# Altium integrated library WE_WR-WTB_Wire to Board Connectors_2.00 mm_rev15c.IntLib: 70 symbols (continued)
## WE-2.00 mm Male Dual Row Vertical Shrouded Header 62402621622
designator C?
WR-WTB_2,00mm; Manufacturer: Würth Elektronik eiSos GmbH; ComponentLink1 Description: Manufacturer; ComponentLink2 Description: Datasheet; NoPins: 26; Created Date: 6 June 2013; partNo: 62402621622; ComponentLink1URL: http://www.we-online.com; ComponentLink2URL: http://katalog.we-online.de/em/datasheet/6240xx21622.pdf; Created by: Karrer Zheng
footprint 62402621622 (26 pins, Dual Rows, Straight, tin plating)
pins: 1, 2, 3, 4, 5, 6, 7, 8, 9, 10, 11, 12, 13, 14, 15, 16, 17, 18, 19, 20, 21, 22, 23, 24, 25, 26

## WE-2.00 mm Male Dual Row Vertical Shrouded Header 62402821622
designator C?
WR-WTB_2,00mm; Manufacturer: Würth Elektronik eiSos GmbH; ComponentLink1 Description: Manufacturer; ComponentLink2 Description: Datasheet; NoPins: 28; Created Date: 6 June 2013; partNo: 62402821622; ComponentLink1URL: http://www.we-online.com; ComponentLink2URL: http://katalog.we-online.de/em/datasheet/6240xx21622.pdf; Created by: Karrer Zheng
footprint 62402821622 (28 pins, Dual Rows, Straight, tin plating)
pins: 1, 2, 3, 4, 5, 6, 7, 8, 9, 10, 11, 12, 13, 14, 15, 16, 17, 18, 19, 20, 21, 22, 23, 24, 25, 26, 27, 28

## WE-2.00 mm Male Dual Row Vertical Shrouded Header 62403021622
designator pppp
WR-WTB_2,00mm; Manufacturer: Würth Elektronik eiSos GmbH; ComponentLink1 Description: Manufacturer; ComponentLink2 Description: Datasheet; NoPins: 30; Created Date: 6 June 2013; partNo: 62403021622; ComponentLink1URL: http://www.we-online.com; ComponentLink2URL: http://katalog.we-online.de/em/datasheet/6240xx21622.pdf; Created by: Karrer Zheng
footprint 62403021622 (30 pins, Dual Rows, Straight, tin plating)
pins: 1, 2, 3, 4, 5, 6, 7, 8, 9, 10, 11, 12, 13, 14, 15, 16, 17, 18, 19, 20, 21, 22, 23, 24, 25, 26, 27, 28, 29, 30

## WE-2.00 mm Male Dual Row Vertical Shrouded Header 62403221622
designator C?
WR-WTB_2,00mm; Manufacturer: Würth Elektronik eiSos GmbH; ComponentLink1 Description: Manufacturer; ComponentLink2 Description: Datasheet; NoPins: 32; Created Date: 6 June 2013; partNo: 62403221622; ComponentLink1URL: http://www.we-online.com; ComponentLink2URL: http://katalog.we-online.de/em/datasheet/6240xx21622.pdf; Created by: Karrer Zheng
footprint 62403221622 (32 pins, Dual Rows, Straight, tin plating)
pins: 1, 2, 3, 4, 5, 6, 7, 8, 9, 10, 11, 12, 13, 14, 15, 16, 17, 18, 19, 20, 21, 22, 23, 24, 25, 26, 27, 28, 29, 30, 31, 32

## WE-2.00 mm Male Dual Row Vertical Shrouded Header 62403421622
designator C?
WR-WTB_2,00mm; Manufacturer: Würth Elektronik eiSos GmbH; ComponentLink1 Description: Manufacturer; ComponentLink2 Description: Datasheet; NoPins: 34; Created Date: 6 June 2013; partNo: 62403421622; ComponentLink1URL: http://www.we-online.com; ComponentLink2URL: http://katalog.we-online.de/em/datasheet/6240xx21622.pdf; Created by: Karrer Zheng
footprint 62403421622 (34 pins, Dual Rows, Straight, tin plating)
pins: 1, 2, 3, 4, 5, 6, 7, 8, 9, 10, 11, 12, 13, 14, 15, 16, 17, 18, 19, 20, 21, 22, 23, 24, 25, 26, 27, 28, 29, 30, 31, 32, 33, 34

## WE-2.00 mm Male Dual Row Vertical Shrouded Header 62403621622
designator C?
WR-WTB_2,00mm; Manufacturer: Würth Elektronik eiSos GmbH; ComponentLink1 Description: Manufacturer; ComponentLink2 Description: Datasheet; NoPins: 36; Created Date: 6 June 2013; partNo: 62403621622; ComponentLink1URL: http://www.we-online.com; ComponentLink2URL: http://katalog.we-online.de/em/datasheet/6240xx21622.pdf; Created by: Karrer Zheng
footprint 62403621622 (36 pins, Dual Rows, Straight, tin plating)
pins: 1, 2, 3, 4, 5, 6, 7, 8, 9, 10, 11, 12, 13, 14, 15, 16, 17, 18, 19, 20, 21, 22, 23, 24, 25, 26, 27, 28, 29, 30, 31, 32, 33, 34, 35, 36

## WE-2.00 mm Male Dual Row Vertical Shrouded Header 62403821622
designator C?
WR-WTB_2,00mm; Manufacturer: Würth Elektronik eiSos GmbH; ComponentLink1 Description: Manufacturer; ComponentLink2 Description: Datasheet; NoPins: 38; Created Date: 6 June 2013; partNo: 62403821622; ComponentLink1URL: http://www.we-online.com; ComponentLink2URL: http://katalog.we-online.de/em/datasheet/6240xx21622.pdf; Created by: Karrer Zheng
footprint 62403821622 (38 pins, Dual Rows, Straight, tin plating)
pins: 1, 2, 3, 4, 5, 6, 7, 8, 9, 10, 11, 12, 13, 14, 15, 16, 17, 18, 19, 20, 21, 22, 23, 24, 25, 26, 27, 28, 29, 30, 31, 32, 33, 34, 35, 36, 37, 38

## WE-2.00 mm Male Dual Row Vertical Shrouded Header 62404021622
designator C?
WR-WTB_2,00mm; Manufacturer: Würth Elektronik eiSos GmbH; ComponentLink1 Description: Manufacturer; ComponentLink2 Description: Datasheet; NoPins: 40; Created Date: 6 June 2013; partNo: 62404021622; ComponentLink1URL: http://www.we-online.com; ComponentLink2URL: http://katalog.we-online.de/em/datasheet/6240xx21622.pdf; Created by: Karrer Zheng
footprint 62404021622 (40 pins, Dual Rows, Straight, tin plating)
pins: 1, 2, 3, 4, 5, 6, 7, 8, 9, 10, 11, 12, 13, 14, 15, 16, 17, 18, 19, 20, 21, 22, 23, 24, 25, 26, 27, 28, 29, 30, 31, 32, 33, 34, 35, 36, 37, 38, 39, 40


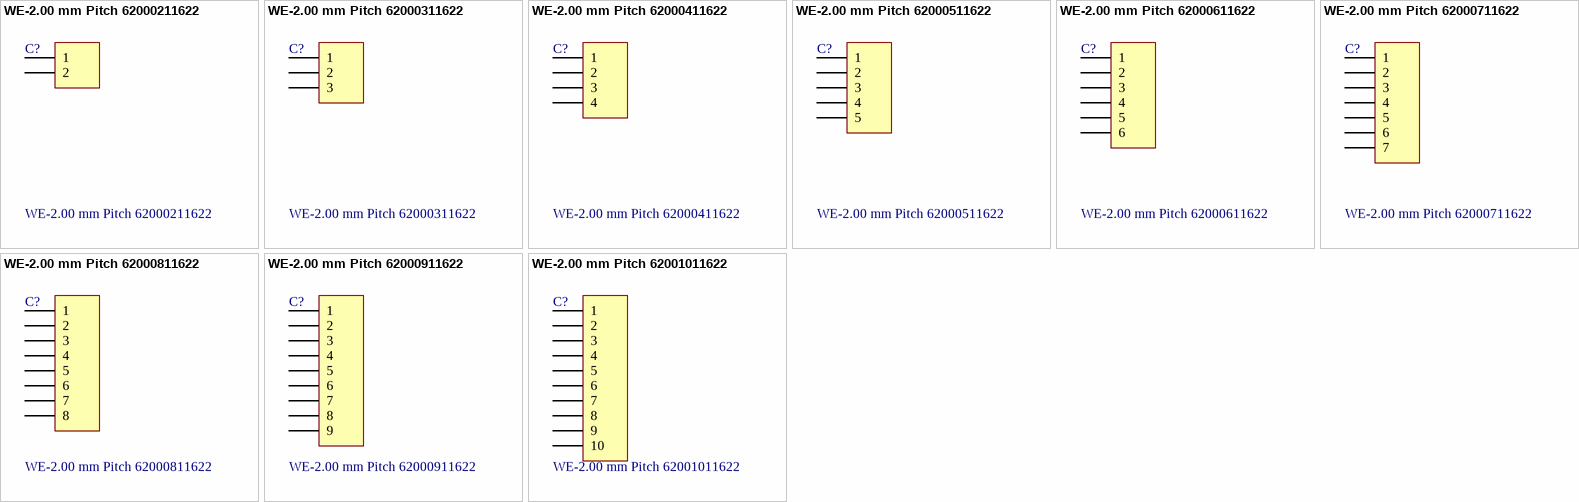
[diagram p3: symbols WE-2.00 mm Pitch 62000211622 to WE-2.00 mm Pitch 62001011622]

## WE-2.00 mm Pitch 62000211622
designator C?
WR-WTB 2.00mm; Manufacturer: Würth Elektronik eiSos GmbH; ComponentLink1 Description: Manufacturer; ComponentLink2 Description: Datasheet; NoPins: 2; Created Date: 27 May 2013; partNo: 62000211622; ComponentLink1URL: http://www.we-online.com; ComponentLink2URL: http://katalog.we-online.de/em/datasheet/6200xx11622.pdf; Created by: Karrer Zheng
footprint 62000211622 (Male Vertical Shrouded Header - 02p 1 row)
pins: 1, 2

## WE-2.00 mm Pitch 62000311622
designator C?
WR-WTB 2.00mm; Manufacturer: Würth Elektronik eiSos GmbH; ComponentLink1 Description: Manufacturer; ComponentLink2 Description: Datasheet; NoPins: 3; Created Date: 27 May 2013; partNo: 62000311622; ComponentLink1URL: http://www.we-online.com; ComponentLink2URL: http://katalog.we-online.de/em/datasheet/6200xx11622.pdf; Created by: Karrer Zheng
footprint 62000311622 (Male Vertical Shrouded Header - 03p 1 row)
pins: 1, 2, 3

## WE-2.00 mm Pitch 62000411622
designator C?
WR-WTB 2.00mm; Manufacturer: Würth Elektronik eiSos GmbH; ComponentLink1 Description: Manufacturer; ComponentLink2 Description: Datasheet; NoPins: 4; Created Date: 27 May 2013; partNo: 62000411622; ComponentLink1URL: http://www.we-online.com; ComponentLink2URL: http://katalog.we-online.de/em/datasheet/6200xx11622.pdf; Created by: Karrer Zheng
footprint 62000411622 (Male Vertical Shrouded Header - 04p 1 row)
pins: 1, 2, 3, 4

## WE-2.00 mm Pitch 62000511622
designator C?
WR-WTB 2.00mm; Manufacturer: Würth Elektronik eiSos GmbH; ComponentLink1 Description: Manufacturer; ComponentLink2 Description: Datasheet; NoPins: 5; Created Date: 27 May 2013; partNo: 62000511622; ComponentLink1URL: http://www.we-online.com; ComponentLink2URL: http://katalog.we-online.de/em/datasheet/6200xx11622.pdf; Created by: Karrer Zheng
footprint 62000511622 (Male Vertical Shrouded Header - 05p 1 row)
pins: 1, 2, 3, 4, 5

## WE-2.00 mm Pitch 62000611622
designator C?
WR-WTB 2.00mm; Manufacturer: Würth Elektronik eiSos GmbH; ComponentLink1 Description: Manufacturer; ComponentLink2 Description: Datasheet; NoPins: 6; Created Date: 27 May 2013; partNo: 62000611622; ComponentLink1URL: http://www.we-online.com; ComponentLink2URL: http://katalog.we-online.de/em/datasheet/6200xx11622.pdf; Created by: Karrer Zheng
footprint 62000611622 (Male Vertical Shrouded Header - 06p 1 row)
pins: 1, 2, 3, 4, 5, 6

## WE-2.00 mm Pitch 62000711622
designator C?
WR-WTB 2.00mm; Manufacturer: Würth Elektronik eiSos GmbH; ComponentLink1 Description: Manufacturer; ComponentLink2 Description: Datasheet; NoPins: 7; Created Date: 27 May 2013; partNo: 62000711622; ComponentLink1URL: http://www.we-online.com; ComponentLink2URL: http://katalog.we-online.de/em/datasheet/6200xx11622.pdf; Created by: Karrer Zheng
footprint 62000711622 (Male Vertical Shrouded Header - 07p 1 row)
pins: 1, 2, 3, 4, 5, 6, 7

## WE-2.00 mm Pitch 62000811622
designator C?
WR-WTB 2.00mm; Manufacturer: Würth Elektronik eiSos GmbH; ComponentLink1 Description: Manufacturer; ComponentLink2 Description: Datasheet; NoPins: 8; Created Date: 27 May 2013; partNo: 62000811622; ComponentLink1URL: http://www.we-online.com; ComponentLink2URL: http://katalog.we-online.de/em/datasheet/6200xx11622.pdf; Created by: Karrer Zheng
footprint 62000811622 (Male Vertical Shrouded Header - 08p 1 row)
pins: 1, 2, 3, 4, 5, 6, 7, 8

## WE-2.00 mm Pitch 62000911622
designator C?
WR-WTB 2.00mm; Manufacturer: Würth Elektronik eiSos GmbH; ComponentLink1 Description: Manufacturer; ComponentLink2 Description: Datasheet; NoPins: 9; Created Date: 27 May 2013; partNo: 62000911622; ComponentLink1URL: http://www.we-online.com; ComponentLink2URL: http://katalog.we-online.de/em/datasheet/6200xx11622.pdf; Created by: Karrer Zheng
footprint 62000911622 (Male Vertical Shrouded Header - 09p 1 row)
pins: 1, 2, 3, 4, 5, 6, 7, 8, 9

## WE-2.00 mm Pitch 62001011622
designator C?
WR-WTB 2.00mm; Manufacturer: Würth Elektronik eiSos GmbH; ComponentLink1 Description: Manufacturer; ComponentLink2 Description: Datasheet; NoPins: 10; Created Date: 27 May 2013; partNo: 62001011622; ComponentLink1URL: http://www.we-online.com; ComponentLink2URL: http://katalog.we-online.de/em/datasheet/6200xx11622.pdf; Created by: Karrer Zheng
footprint 62001011622 (Male Vertical Shrouded Header - 10p 1 row)
pins: 1, 2, 3, 4, 5, 6, 7, 8, 9, 10


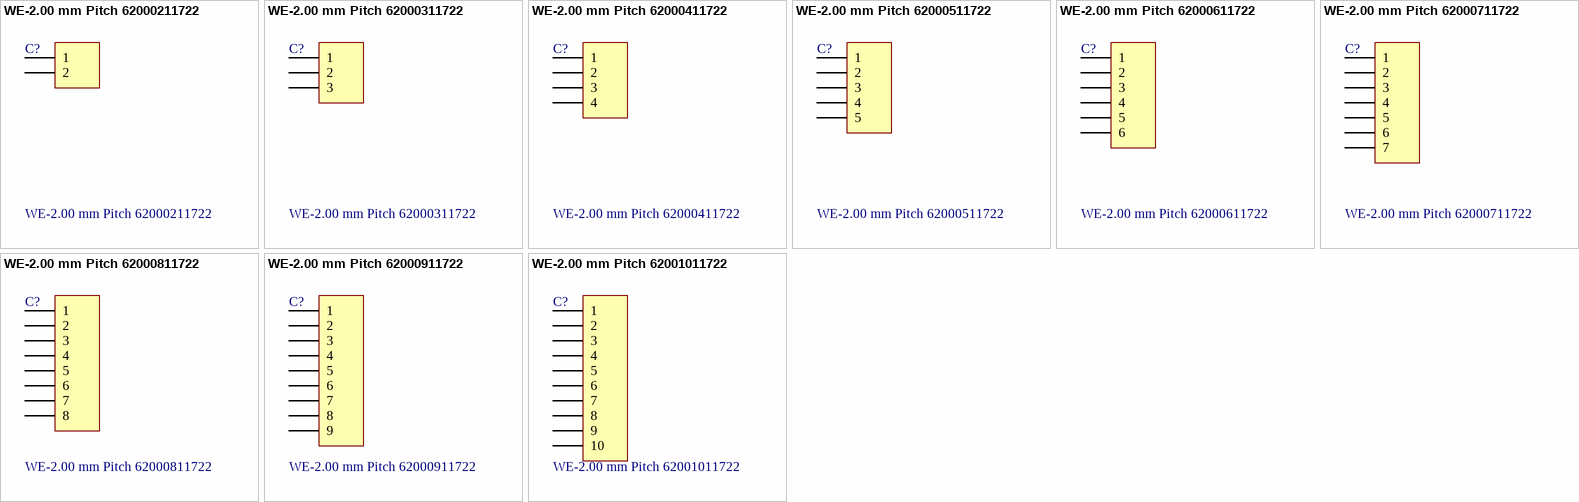
[diagram p4: symbols WE-2.00 mm Pitch 62000211722 to WE-2.00 mm Pitch 62001011722]

## WE-2.00 mm Pitch 62000211722
designator C?
WR-WTB 2.00mm; Manufacturer: Würth Elektronik eiSos GmbH; ComponentLink1 Description: Manufacturer; ComponentLink2 Description: Datasheet; NoPins: 2; Created Date: 27 May 2013; partNo: 62000211722; ComponentLink1URL: http://www.we-online.com; ComponentLink2URL: http://katalog.we-online.de/em/datasheet/6200xx11722.pdf; Created by: Karrer Zheng
footprint 62000211722 (Male Horizontal Shrouded Header - 02p 1 row)
pins: 1, 2

## WE-2.00 mm Pitch 62000311722
designator C?
WR-WTB 2.00mm; Manufacturer: Würth Elektronik eiSos GmbH; ComponentLink1 Description: Manufacturer; ComponentLink2 Description: Datasheet; NoPins: 3; Created Date: 27 May 2013; partNo: 62000311722; ComponentLink1URL: http://www.we-online.com; ComponentLink2URL: http://katalog.we-online.de/em/datasheet/6200xx11722.pdf; Created by: Karrer Zheng
footprint 62000311722 (Male Horizontal Shrouded Header - 03p 1 row)
pins: 1, 2, 3

## WE-2.00 mm Pitch 62000411722
designator C?
WR-WTB 2.00mm; Manufacturer: Würth Elektronik eiSos GmbH; ComponentLink1 Description: Manufacturer; ComponentLink2 Description: Datasheet; NoPins: 4; Created Date: 27 May 2013; partNo: 62000411722; ComponentLink1URL: http://www.we-online.com; ComponentLink2URL: http://katalog.we-online.de/em/datasheet/6200xx11722.pdf; Created by: Karrer Zheng
footprint 62000411722 (Male Horizontal Shrouded Header - 04p 1 row)
pins: 1, 2, 3, 4

## WE-2.00 mm Pitch 62000511722
designator C?
WR-WTB 2.00mm; Manufacturer: Würth Elektronik eiSos GmbH; ComponentLink1 Description: Manufacturer; ComponentLink2 Description: Datasheet; NoPins: 5; Created Date: 27 May 2013; partNo: 62000511722; ComponentLink1URL: http://www.we-online.com; ComponentLink2URL: http://katalog.we-online.de/em/datasheet/6200xx11722.pdf; Created by: Karrer Zheng
footprint 62000511722 (Male Horizontal Shrouded Header - 05p 1 row)
pins: 1, 2, 3, 4, 5

## WE-2.00 mm Pitch 62000611722
designator C?
WR-WTB 2.00mm; Manufacturer: Würth Elektronik eiSos GmbH; ComponentLink1 Description: Manufacturer; ComponentLink2 Description: Datasheet; NoPins: 6; Created Date: 27 May 2013; partNo: 62000611722; ComponentLink1URL: http://www.we-online.com; ComponentLink2URL: http://katalog.we-online.de/em/datasheet/6200xx11722.pdf; Created by: Karrer Zheng
footprint 62000611722 (Male Horizontal Shrouded Header - 06p 1 row)
pins: 1, 2, 3, 4, 5, 6

## WE-2.00 mm Pitch 62000711722
designator C?
WR-WTB 2.00mm; Manufacturer: Würth Elektronik eiSos GmbH; ComponentLink1 Description: Manufacturer; ComponentLink2 Description: Datasheet; NoPins: 7; Created Date: 27 May 2013; partNo: 62000711722; ComponentLink1URL: http://www.we-online.com; ComponentLink2URL: http://katalog.we-online.de/em/datasheet/6200xx11722.pdf; Created by: Karrer Zheng
footprint 62000711722 (Male Horizontal Shrouded Header - 07p 1 row)
pins: 1, 2, 3, 4, 5, 6, 7

## WE-2.00 mm Pitch 62000811722
designator C?
WR-WTB 2.00mm; Manufacturer: Würth Elektronik eiSos GmbH; ComponentLink1 Description: Manufacturer; ComponentLink2 Description: Datasheet; NoPins: 8; Created Date: 27 May 2013; partNo: 62000811722; ComponentLink1URL: http://www.we-online.com; ComponentLink2URL: http://katalog.we-online.de/em/datasheet/6200xx11722.pdf; Created by: Karrer Zheng
footprint 62000811722 (Male Horizontal Shrouded Header - 08p 1 row)
pins: 1, 2, 3, 4, 5, 6, 7, 8

## WE-2.00 mm Pitch 62000911722
designator C?
WR-WTB 2.00mm; Manufacturer: Würth Elektronik eiSos GmbH; ComponentLink1 Description: Manufacturer; ComponentLink2 Description: Datasheet; NoPins: 9; Created Date: 27 May 2013; partNo: 62000911722; ComponentLink1URL: http://www.we-online.com; ComponentLink2URL: http://katalog.we-online.de/em/datasheet/6200xx11722.pdf; Created by: Karrer Zheng
footprint 62000911722 (Male Horizontal Shrouded Header - 09p 1 row)
pins: 1, 2, 3, 4, 5, 6, 7, 8, 9

## WE-2.00 mm Pitch 62001011722
designator C?
WR-WTB 2.00mm; Manufacturer: Würth Elektronik eiSos GmbH; ComponentLink1 Description: Manufacturer; ComponentLink2 Description: Datasheet; NoPins: 10; Created Date: 27 May 2013; partNo: 62001011722; ComponentLink1URL: http://www.we-online.com; ComponentLink2URL: http://katalog.we-online.de/em/datasheet/6200xx11722.pdf; Created by: Karrer Zheng
footprint 62001011722 (Male Horizontal Shrouded Header - 10p 1 row)
pins: 1, 2, 3, 4, 5, 6, 7, 8, 9, 10


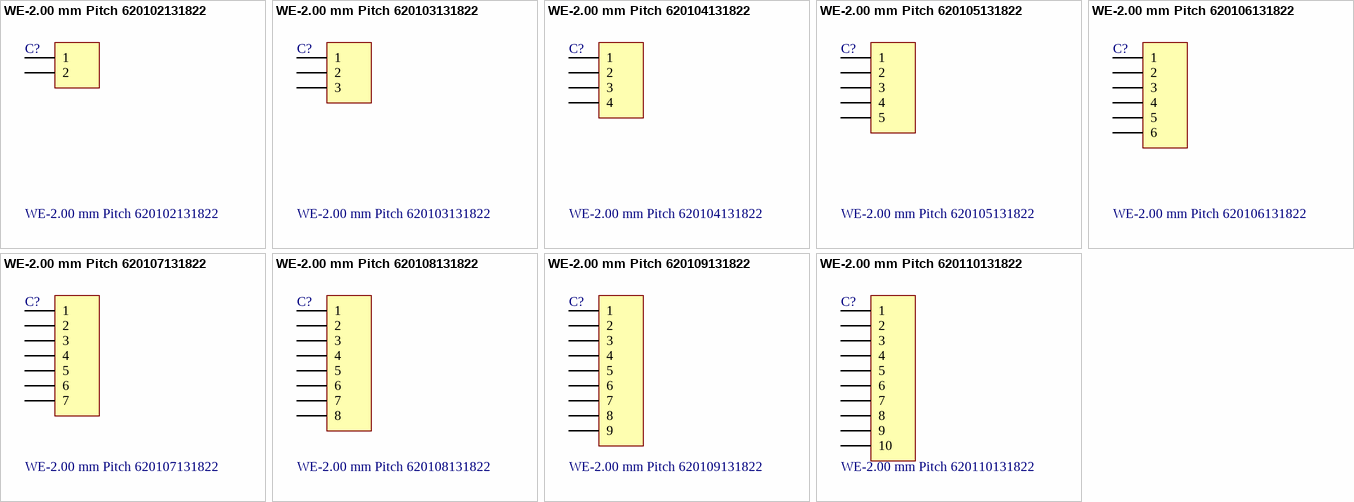
[diagram p5: symbols WE-2.00 mm Pitch 620102131822 to WE-2.00 mm Pitch 620110131822]

## WE-2.00 mm Pitch 620102131822
designator C?
WR-WTB 2.00mm; Manufacturer: Würth Elektronik eiSos GmbH; ComponentLink1 Description: Manufacturer; ComponentLink2 Description: Datasheet; NoPins: 2; Created Date: 3 June 2013; partNo: 620102131822; ComponentLink1URL: http://www.we-online.com; ComponentLink2URL: http://katalog.we-online.de/em/datasheet/6201xx131822.pdf; Created by: Karrer Zheng
footprint 620102131822
pins: 1, 2

## WE-2.00 mm Pitch 620103131822
designator C?
WR-WTB 2.00mm; Manufacturer: Würth Elektronik eiSos GmbH; ComponentLink1 Description: Manufacturer; ComponentLink2 Description: Datasheet; NoPins: 3; Created Date: 3 June 2013; partNo: 620103131822; ComponentLink1URL: http://www.we-online.com; ComponentLink2URL: http://katalog.we-online.de/em/datasheet/6201xx131822.pdf; Created by: Karrer Zheng
footprint 620103131822
pins: 1, 2, 3

## WE-2.00 mm Pitch 620104131822
designator C?
WR-WTB 2.00mm; Manufacturer: Würth Elektronik eiSos GmbH; ComponentLink1 Description: Manufacturer; ComponentLink2 Description: Datasheet; NoPins: 4; Created Date: 3 June 2013; partNo: 620104131822; ComponentLink1URL: http://www.we-online.com; ComponentLink2URL: http://katalog.we-online.de/em/datasheet/6201xx131822.pdf; Created by: Karrer Zheng
footprint 620104131822
pins: 1, 2, 3, 4

## WE-2.00 mm Pitch 620105131822
designator C?
WR-WTB 2.00mm; Manufacturer: Würth Elektronik eiSos GmbH; ComponentLink1 Description: Manufacturer; ComponentLink2 Description: Datasheet; NoPins: 5; Created Date: 3 June 2013; partNo: 620105131822; ComponentLink1URL: http://www.we-online.com; ComponentLink2URL: http://katalog.we-online.de/em/datasheet/6201xx131822.pdf; Created by: Karrer Zheng
footprint 620105131822
pins: 1, 2, 3, 4, 5

## WE-2.00 mm Pitch 620106131822
designator C?
WR-WTB 2.00mm; Manufacturer: Würth Elektronik eiSos GmbH; ComponentLink1 Description: Manufacturer; ComponentLink2 Description: Datasheet; NoPins: 6; Created Date: 3 June 2013; partNo: 620106131822; ComponentLink1URL: http://www.we-online.com; ComponentLink2URL: http://katalog.we-online.de/em/datasheet/6201xx131822.pdf; Created by: Karrer Zheng
footprint 620106131822
pins: 1, 2, 3, 4, 5, 6

## WE-2.00 mm Pitch 620107131822
designator C?
WR-WTB 2.00mm; Manufacturer: Würth Elektronik eiSos GmbH; ComponentLink1 Description: Manufacturer; ComponentLink2 Description: Datasheet; NoPins: 7; Created Date: 3 June 2013; partNo: 620107131822; ComponentLink1URL: http://www.we-online.com; ComponentLink2URL: http://katalog.we-online.de/em/datasheet/6201xx131822.pdf; Created by: Karrer Zheng
footprint 620107131822
pins: 1, 2, 3, 4, 5, 6, 7

## WE-2.00 mm Pitch 620108131822
designator C?
WR-WTB 2.00mm; Manufacturer: Würth Elektronik eiSos GmbH; ComponentLink1 Description: Manufacturer; ComponentLink2 Description: Datasheet; NoPins: 8; Created Date: 3 June 2013; partNo: 620108131822; ComponentLink1URL: http://www.we-online.com; ComponentLink2URL: http://katalog.we-online.de/em/datasheet/6201xx131822.pdf; Created by: Karrer Zheng
footprint 620108131822
pins: 1, 2, 3, 4, 5, 6, 7, 8

## WE-2.00 mm Pitch 620109131822
designator C?
WR-WTB 2.00mm; Manufacturer: Würth Elektronik eiSos GmbH; ComponentLink1 Description: Manufacturer; ComponentLink2 Description: Datasheet; NoPins: 9; Created Date: 3 June 2013; partNo: 620109131822; ComponentLink1URL: http://www.we-online.com; ComponentLink2URL: http://katalog.we-online.de/em/datasheet/6201xx131822.pdf; Created by: Karrer Zheng
footprint 620109131822
pins: 1, 2, 3, 4, 5, 6, 7, 8, 9

## WE-2.00 mm Pitch 620110131822
designator C?
WR-WTB 2.00mm; Manufacturer: Würth Elektronik eiSos GmbH; ComponentLink1 Description: Manufacturer; ComponentLink2 Description: Datasheet; NoPins: 10; Created Date: 3 June 2013; partNo: 620110131822; ComponentLink1URL: http://www.we-online.com; ComponentLink2URL: http://katalog.we-online.de/em/datasheet/6201xx131822.pdf; Created by: Karrer Zheng
footprint 620110131822
pins: 1, 2, 3, 4, 5, 6, 7, 8, 9, 10


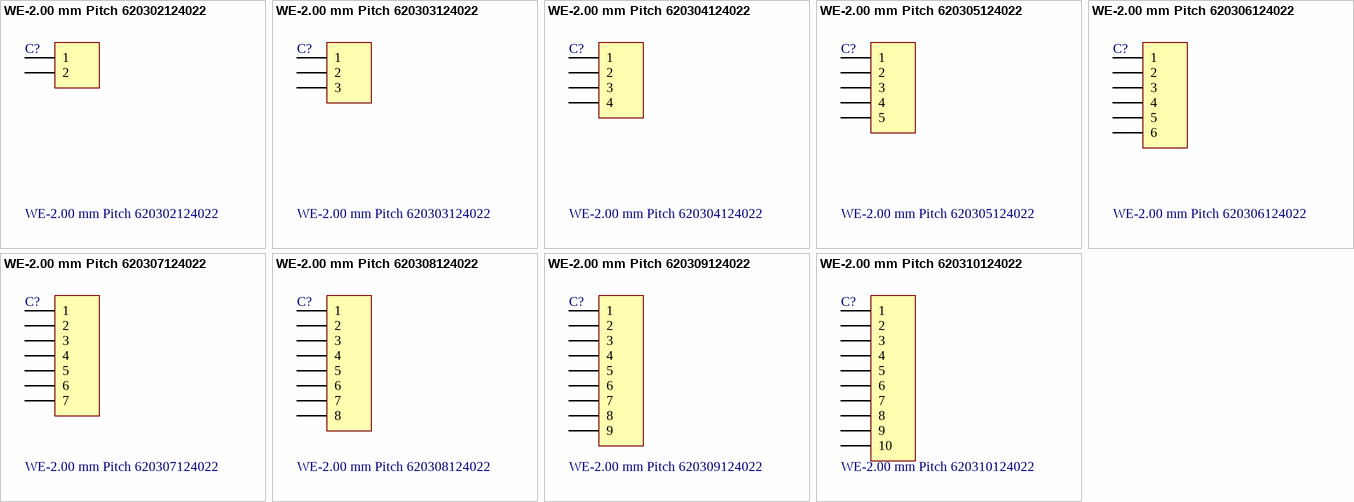
[diagram p6: symbols WE-2.00 mm Pitch 620302124022 to WE-2.00 mm Pitch 620310124022]

## WE-2.00 mm Pitch 620302124022
designator C?
WR-WTB 2.00mm; Manufacturer: Würth Elektronik eiSos GmbH; ComponentLink1 Description: Manufacturer; ComponentLink2 Description: Datasheet; NoPins: 2; Created Date: 27 May 2013; partNo: 620302124022; ComponentLink1URL: http://www.we-online.com; ComponentLink2URL: http://katalog.we-online.de/em/datasheet/6203xx124022.pdf; Created by: Karrer Zheng
footprint 620302124022 (SMT Male Vertical Shrouded Header - 02p 1 row - Pick & Place Cap - T & R packaging)
pins: 1, 2

## WE-2.00 mm Pitch 620303124022
designator C?
WR-WTB 2.00mm; Manufacturer: Würth Elektronik eiSos GmbH; ComponentLink1 Description: Manufacturer; ComponentLink2 Description: Datasheet; NoPins: 3; Created Date: 27 May 2013; partNo: 620303124022; ComponentLink1URL: http://www.we-online.com; ComponentLink2URL: http://katalog.we-online.de/em/datasheet/6203xx124022.pdf; Created by: Karrer Zheng
footprint 620303124022 (SMT Male Vertical Shrouded Header - 03p 1 row - Pick & Place Cap - T & R packaging)
pins: 1, 2, 3

## WE-2.00 mm Pitch 620304124022
designator C?
WR-WTB 2.00mm; Manufacturer: Würth Elektronik eiSos Gmbh; ComponentLink1 Description: Manufacturer; ComponentLink2 Description: Datasheet; NoPins: 4; Created Date: 27 May 2013; partNo: 620304124022; ComponentLink1URL: http://www.we-online.com; ComponentLink2URL: http://katalog.we-online.de/em/datasheet/6203xx124022.pdf; Created by: Karrer Zheng
footprint 620304124022 (SMT Male Vertical Shrouded Header - 04p 1 row - Pick & Place Cap - T & R packaging)
pins: 1, 2, 3, 4

## WE-2.00 mm Pitch 620305124022
designator C?
WR-WTB 2.00mm; Manufacturer: Würth Elektronik eiSos GmbH; ComponentLink1 Description: Manufacturer; ComponentLink2 Description: Datasheet; NoPins: 5; Created Date: 27 May 2013; partNo: 620305124022; ComponentLink1URL: http://www.we-online.com; ComponentLink2URL: http://katalog.we-online.de/em/datasheet/6203xx124022.pdf; Created by: Karrer Zheng
footprint 620305124022 (SMT Male Vertical Shrouded Header - 05p 1 row - Pick & Place Cap - T & R packaging)
pins: 1, 2, 3, 4, 5

## WE-2.00 mm Pitch 620306124022
designator C?
WR-WTB 2.00mm; Manufacturer: Würth Elektronik eiSos GmbH; ComponentLink1 Description: Manufacturer; ComponentLink2 Description: Datasheet; NoPins: 6; Created Date: 27 May 2013; partNo: 620306124022; ComponentLink1URL: http://www.we-online.com; ComponentLink2URL: http://katalog.we-online.de/em/datasheet/6203xx124022.pdf; Created by: Karrer Zheng
footprint 620306124022 (SMT Male Vertical Shrouded Header - 06p 1 row - Pick & Place Cap - T & R packaging)
pins: 1, 2, 3, 4, 5, 6

## WE-2.00 mm Pitch 620307124022
designator C?
WR-WTB 2.00mm; Manufacturer: Würth Elektronik eiSos GmbH; ComponentLink1 Description: Manufacturer; ComponentLink2 Description: Datasheet; NoPins: 7; Created Date: 27 May 2013; partNo: 620307124022; ComponentLink1URL: http://www.we-online.com; ComponentLink2URL: http://katalog.we-online.de/em/datasheet/6203xx124022.pdf; Created by: Karrer Zheng
footprint 620307124022 (SMT Male Vertical Shrouded Header - 07p 1 row - Pick & Place Cap - T & R packaging)
pins: 1, 2, 3, 4, 5, 6, 7

## WE-2.00 mm Pitch 620308124022
designator C?
WR-WTB 2.00mm; Manufacturer: Würth Elektronik eiSos GmbH; ComponentLink1 Description: Manufacturer; ComponentLink2 Description: Datasheet; NoPins: 8; Created Date: 27 May 2013; partNo: 620308124022; ComponentLink1URL: http://www.we-online.com; ComponentLink2URL: http://katalog.we-online.de/em/datasheet/6203xx124022.pdf; Created by: Karrer Zheng
footprint 620308124022 (SMT Male Vertical Shrouded Header - 08p 1 row - Pick & Place Cap - T & R packaging)
pins: 1, 2, 3, 4, 5, 6, 7, 8

## WE-2.00 mm Pitch 620309124022
designator C?
WR-WTB 2.00mm; Manufacturer: Würth Elektronik eiSos GmbH; ComponentLink1 Description: Manufacturer; ComponentLink2 Description: Datasheet; NoPins: 9; Created Date: 27 May 2013; partNo: 620309124022; ComponentLink1URL: http://www.we-online.com; ComponentLink2URL: http://katalog.we-online.de/em/datasheet/6203xx124022.pdf; Created by: Karrer Zheng
footprint 620309124022 (SMT Male Vertical Shrouded Header - 09p 1 row - Pick & Place Cap - T & R packaging)
pins: 1, 2, 3, 4, 5, 6, 7, 8, 9

## WE-2.00 mm Pitch 620310124022
designator C?
WR-WTB 2.00mm; Manufacturer: Würth Elektronik eiSos GmbH; ComponentLink1 Description: Manufacturer; ComponentLink2 Description: Datasheet; NoPins: 10; Created Date: 27 May 2013; partNo: 620310124022; ComponentLink1URL: http://www.we-online.com; ComponentLink2URL: http://katalog.we-online.de/em/datasheet/6203xx124022.pdf; Created by: Karrer Zheng
footprint 620310124022 (SMT Male Vertical Shrouded Header - 10p 1 row - Pick & Place Cap - T & R packaging)
pins: 1, 2, 3, 4, 5, 6, 7, 8, 9, 10